# Altium footprint library Footprint_Library.PcbLib: 25 footprints (part 2 of 2)
Each footprint in its own frame and in the unit in brackets; x right, y up, seen from the top. Pads: shape width x height; smd on the part's side, far side on the other; paste and mask are expansions set on the pad; w line width, h text height; cw(c..) or ccw(c..) is an arc to the next point about the centre after c.
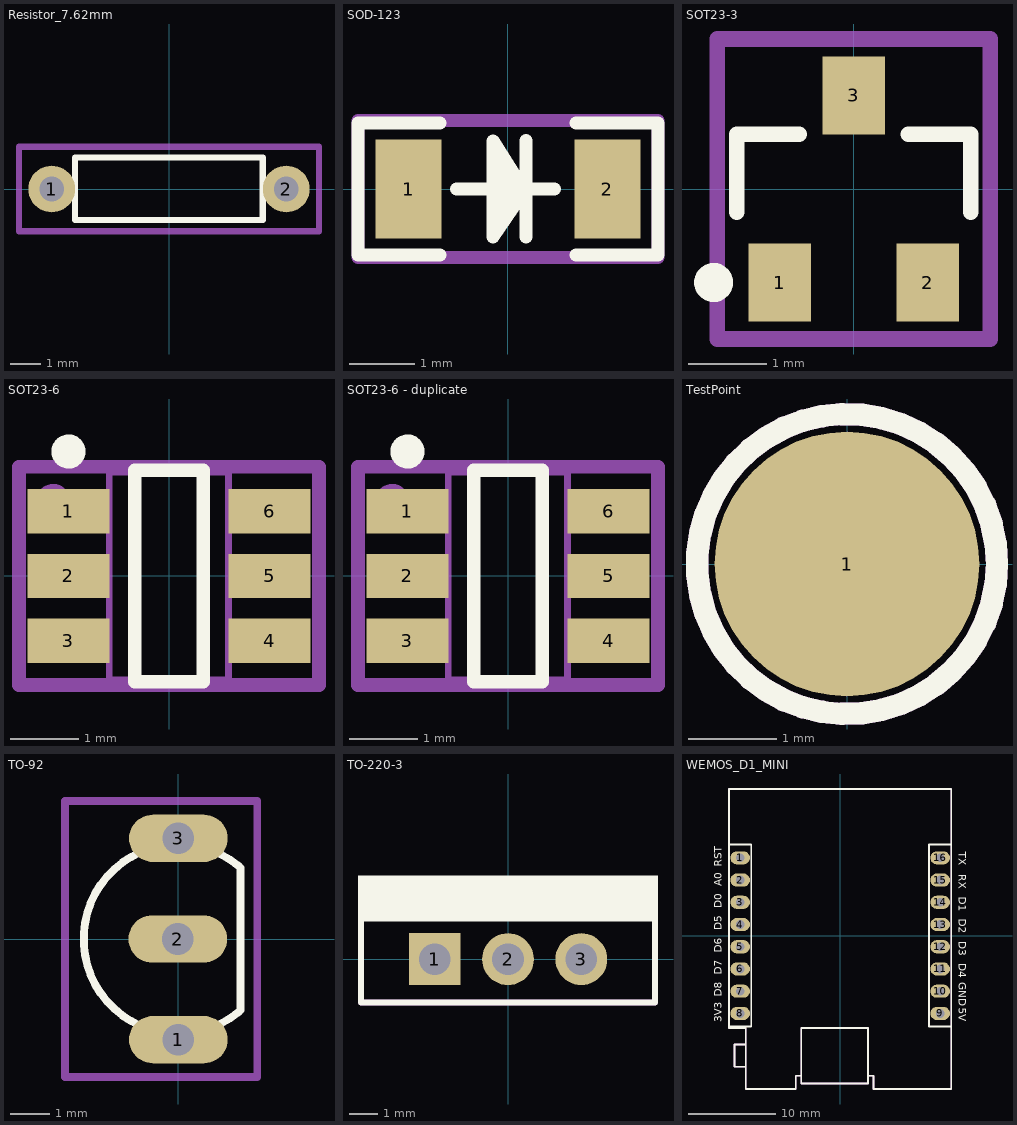
[diagram p1: the footprints below, top view; thin cyan lines are the x and y axes]

## Resistor_7.62mm [mil]
pads (2):
  round 60 hole 31.5: 1(-150,0) 2(150,0)
Top Overlay:
  lines w7.87: -120.08,-39.73 -120.08,40.27 119.92,40.27 119.92,-39.73 -120.08,-39.73
Mechanical 2:
  lines w7.87: -191.93,-54.13 -191.93,54.13 191.93,54.13 191.93,-54.13 -191.93,-54.13
  text "'.Designator'" at -93.5,-14.76 h39.37
3D body "SW3DPS-RESISTOR 7_62MM DIP-DEFAULT.STEP": height 78.74, standoff -78.74, extent -159.44,-42.12 159.46,36.62

## SOD-123 [mil]
pads (2):
  rect 40x60 smd: 1(-60,0) 2(60,0)
Top Overlay:
  lines w7.87: -41,-39.94 -90.55,-39.94 -90.55,39.94 -41,39.94 ; -31,0 -11,0 ; -6,-20.91 -6,20.09 ; -6,18.09 4,0.09 -6,-15.91 -3,2.09 ; 10,0 28,0 ; 10.97,-28.91 10.97,-0.91 ; 10.97,-3.87 10.97,29.13 ; 41,-39.94 90.55,-39.94 90.55,39.94 41,39.94 ; -9,-28.91 -9,29.09 10,-0.91 -9,-28.91
Mechanical 2:
  lines w5: -6,-20.91 -6,20.09 ; 10.97,-28.91 10.97,-0.91 ; 10.97,-3.87 10.97,29.13 ; -9,-28.91 -9,29.09 10,-0.91 -9,-28.91
  lines w7.87: -90.55,-41.34 90.55,-41.34 90.55,41.34 -90.55,41.34 -90.55,-41.34
  lines w10: -6,18.09 4,0.09 -6,-15.91 -3,2.09
  text "'.Designator'" at -66.93,-21.65 h39.37
3D body "CircuitWorks-SOD123.step": height 50, standoff 0, extent -72.83,-31.5 72.84,31.5

## SOT23-3 [mm] "SOT23, 3-Leads, Body 2.90x2.45mm, Pitch 0.95mm, IPC Medium Density"
height 1.1
pads (3):
  rect 0.8x1 smd: 1(-0.95,-1.2) 2(0.95,-1.2) 3(0,1.2)
Top Overlay:
  circle w0.25: c-1.8,-1.2 r0.125
  lines w0.2: -1.5,-0.3 -1.5,0.7 -0.7,0.7 ; 0.7,0.7 1.5,0.7 1.5,-0.3
Mechanical 2:
  lines w0.2: -1.75,-1.925 -1.75,1.925 1.75,1.925 1.75,-1.925 -1.75,-1.925
  text "'.Designator'" at -1,-0.4 h1
3D body "SOT95P245X110-3N.step": height 1.1, standoff 0, extent -1.5,-1.3 1.5,1.3

## SOT23-6 [mm] "SOT23, 5-Leads, Body 2.90x2.80mm, Pitch 0.95mm, IPC Low Density"
height 1.1
pads (6):
  rect 1.2x0.65 smd: 1(-1.475,0.95) 2(-1.475,0) 3(-1.475,-0.95) 4(1.475,-0.95) 5(1.475,0) 6(1.475,0.95)
Top Overlay:
  circle w0.25: c-1.475,1.825 r0.125
  lines w0.2: -0.5,-1.55 0.5,-1.55 0.5,1.55 -0.5,1.55 -0.5,-1.55
Mechanical 2:
  circle w0.25: c-1.7,1.1 r0.125
  lines w0.2: -2.2,-1.6 -2.2,1.6 2.2,1.6 2.2,-1.6 -2.2,-1.6
  text "'.Designator'" at -1.5,-0.7 h1
Mechanical 13:
  lines w0.1: -0.875,-1.525 -0.875,1.525 0.875,1.525 0.875,-1.525 -0.875,-1.525
3D body "SOT95P280X95-6N.step": height 0.95, standoff 0, extent -1.4,-1.45 1.4,1.45

## SOT23-6 - duplicate [mm] "SOT23, 5-Leads, Body 2.90x2.80mm, Pitch 0.95mm, IPC Low Density"
height 1.1
pads (6):
  rect 1.2x0.65 smd: 1(-1.475,0.95) 2(-1.475,0) 3(-1.475,-0.95) 4(1.475,-0.95) 5(1.475,0) 6(1.475,0.95)
Top Overlay:
  circle w0.25: c-1.475,1.825 r0.125
  lines w0.2: -0.5,-1.55 0.5,-1.55 0.5,1.55 -0.5,1.55 -0.5,-1.55
Mechanical 2:
  circle w0.25: c-1.7,1.1 r0.125
  lines w0.2: -2.2,-1.6 -2.2,1.6 2.2,1.6 2.2,-1.6 -2.2,-1.6
  text "'.Designator'" at -1.5,-0.7 h1
Mechanical 13:
  lines w0.1: -0.875,-1.525 -0.875,1.525 0.875,1.525 0.875,-1.525 -0.875,-1.525
3D body "SOT95P280X95-6N.step": height 0.95, standoff 0, extent -1.4,-1.45 1.4,1.45

## TestPoint [mm]
pads (1):
  round 3 smd: 1(0,0)
Top Overlay:
  circle w0.254: c0,0 r1.7
Mechanical 2:
  circle w0.254: c0,0 r1.7

## TO-92 [mm] "TO, Flat Index; 3 In-Line, Axial Leads; Body Dia. 4.6mm; Leads 0.48 x 0.41 mm (max)"
height 7.62
pads (3):
  oval 2.5x1.2 hole 0.8: 1(0.007,-2.551) 2(-0.007,0) 3(0.007,2.551)
Top Overlay:
  lines w0.2: 1.543,-1.844 cw(c0.007,0) 1.543,1.844 ; 1.583,-1.801 1.583,1.799
Mechanical 2:
  lines w0.2: -2.868,-3.5 2.007,-3.5 2.007,3.5 -2.868,3.5 -2.868,-3.5
  text "'.Designator'" at 0.375,-2.375 h1
3D body "User Library-TO-92 Fashioned.STEP": height 8.19, standoff -1.31, extent -2.62,-2.79 1.584,2.79

## TO-220-3 [mm]
pads (3):
  rect 1.8x1.8 hole 1.1: 1(-2.54,0)
  round 1.8 hole 1.1: 2(0,0) 3(2.54,0)
Top Overlay:
  rectangle: -5.2,1.4 5.2,2.9
  lines w0.2: -5.1,-1.5 -5.1,1.4 5.1,1.4 5.1,-1.5 -5.1,-1.5
Mechanical 2:
  lines w0.2: -5.1,-1.5 -5.1,1.6 5.1,1.6 5.1,-1.5 -5.1,-1.5
  text "'.Designator'" at -1.473,-0.432 h1
3D body "User Library-TO220-AB Full.STEP": height 18.95, standoff -10.08, extent -4.95,-1.55 4.95,2.907

## WEMOS_D1_MINI [mm]
pads (16):
  oval 2.25x1.5 hole 1: 1(-11.43,8.89) 2(-11.43,6.35) 3(-11.43,3.81) 4(-11.43,1.27) 5(-11.43,-1.27) 6(-11.43,-3.81) 7(-11.43,-6.35) 8(-11.43,-8.89) 9(11.43,-8.89) 10(11.43,-6.35) 11(11.43,-3.81) 12(11.43,-1.27) 13(11.43,1.27) 14(11.43,3.81) 15(11.43,6.35) 16(11.43,8.89)
Top Overlay:
  lines w0.2: -12.7,-9.4 -12.7,11.425 ; 12.71,-10.4 10.16,-10.4 10.16,10.425 12.71,10.425 ; 12.71,-9.4 12.71,11.425 ; -10.795,-14.99 -12.065,-14.99 -12.065,-12.45 -10.795,-12.45 ; -10.795,-14.99 -10.795,-17.53 -5.08,-17.53 -5.08,-16.006 -4.445,-16.006 ; -10.795,-14.99 -10.795,-12.45 ; -10.795,-12.45 -10.795,-10.545 -12.7,-10.545 -12.7,16.76 12.7,16.76 12.7,-17.53 3.81,-17.53 3.81,-16.006 3.175,-16.006 ; -4.445,-16.006 -4.445,-15.625 -4.445,-10.545 3.175,-10.545 3.175,-15.625 3.175,-16.006 ; -4.445,-16.006 -4.445,-16.895 3.175,-16.895 3.175,-16.006 ; -12.7,-10.4 -10.15,-10.4 -10.15,10.425 -12.7,10.425 -12.7,-10.4
  text "D2" at 13.212,1.922 h1.52
  text "D1" at 13.216,4.464 h1.52
  text "GND" at 13.219,-5.31 h1.52
  text "3V3" at -13.175,-9.884 h1.52
  text "A0" at -13.176,5.654 h1.52
  text "RST" at -13.176,7.884 h1.52
  text "D0" at -13.176,3.14 h1.52
  text "D5" at -13.182,0.621 h1.52
  text "D6" at -13.183,-1.933 h1.52
  text "D7" at -13.176,-4.462 h1.52
  text "D8" at -13.176,-7.005 h1.52
  text "5V" at 13.225,-8.225 h1.52
  text "RX" at 13.219,7.021 h1.52
  text "TX" at 13.219,9.577 h1.52
  text "D3" at 13.218,-0.617 h1.52
  text "D4" at 13.219,-3.136 h1.52
Mechanical 2:
  lines w0.2: -10.795,-14.99 -12.065,-14.99 -12.065,-12.45 -10.795,-12.45 ; -10.795,-14.99 -10.795,-17.53 -5.08,-17.53 -5.08,-16.006 -4.445,-16.006 ; -10.795,-14.99 -10.795,-12.45 ; -10.795,-12.45 -10.795,-10.545 -12.7,-10.545 -12.7,16.76 12.7,16.76 12.7,-17.53 3.81,-17.53 3.81,-16.006 3.175,-16.006 ; -4.445,-16.006 -4.445,-15.625 -4.445,-10.545 3.175,-10.545 3.175,-15.625 3.175,-16.006 ; -4.445,-16.006 -4.445,-16.895 3.175,-16.895 3.175,-16.006
  text "WEMOS D1 MINI" at -9.525,8.025 h1.52
  text "'.Designator'" at -5.025,11.7 h1
  text "D2" at 13.212,1.922 h1.52
  text "D1" at 13.216,4.464 h1.52
  text "GND" at 13.219,-5.31 h1.52
  text "3V3" at -13.175,-9.884 h1.52
  text "A0" at -13.176,5.654 h1.52
  text "RST" at -13.176,7.884 h1.52
  text "D0" at -13.176,3.14 h1.52
  text "D5" at -13.182,0.621 h1.52
  text "D6" at -13.183,-1.933 h1.52
  text "D7" at -13.176,-4.462 h1.52
  text "D8" at -13.176,-7.005 h1.52
  text "5V" at 13.225,-8.225 h1.52
  text "RX" at 13.219,7.021 h1.52
  text "TX" at 13.219,9.577 h1.52
  text "D3" at 13.218,-0.617 h1.52
  text "D4" at 13.219,-3.136 h1.52
3D body "WiFi D1 MINI with pins v1.step": height 14.6, standoff 0.44, extent -12.862,-17.498 12.875,16.75
3D body "zl262-8s_p2-54_l20-8_w2-54_h8-5.stp": height 8.5, standoff -3, extent -12.7,-10.41 -10.16,10.41
3D body "zl262-8s_p2-54_l20-8_w2-54_h8-5.stp": height 8.5, standoff -3, extent 10.16,-10.41 12.7,10.41